# Altium schematic symbol library LATTICEPLDS_Library.SchLib: 291 symbols (part 17 of 32)
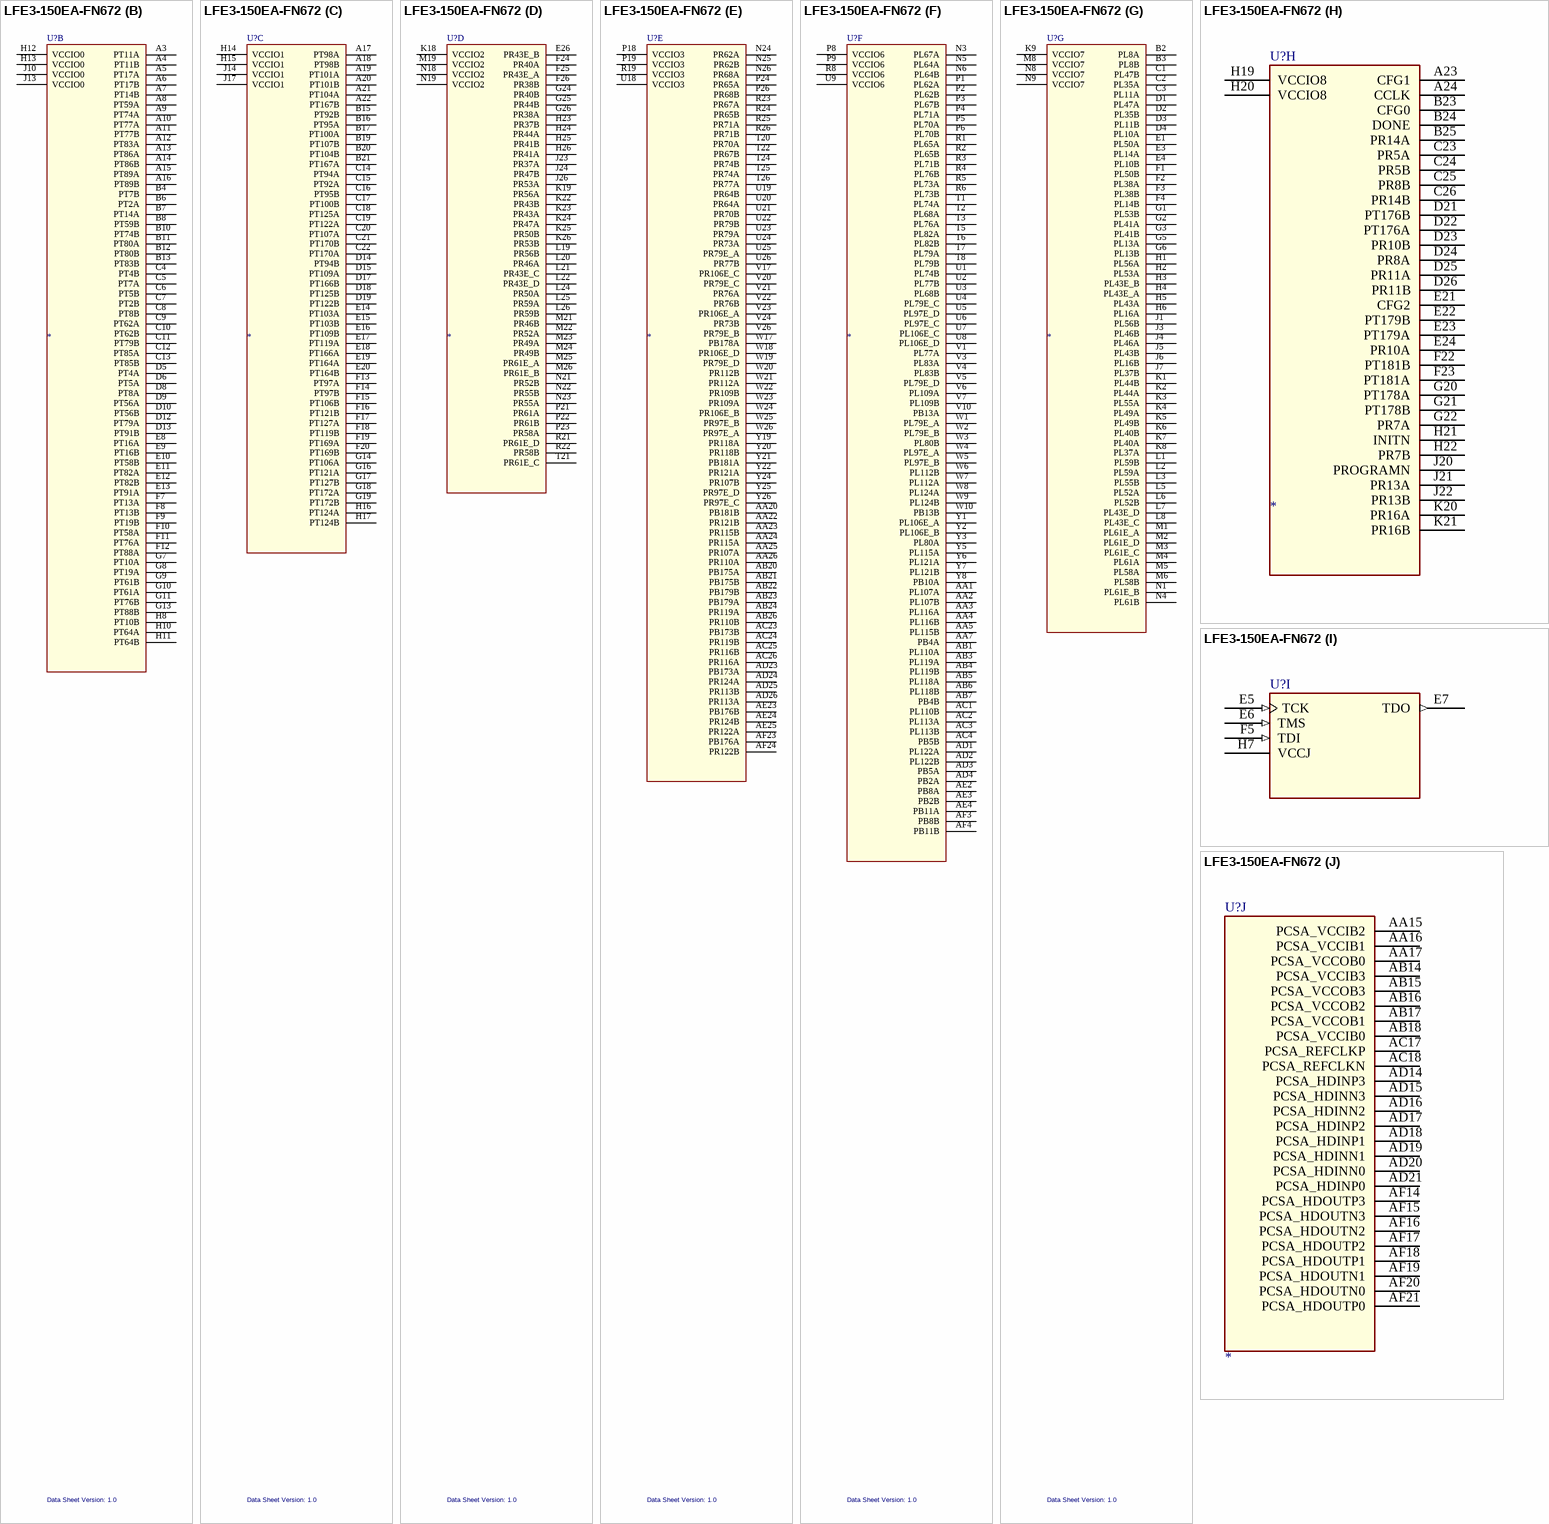
[diagram p319: symbol LFE3-150EA-FN672]

## LFE3-150EA-FN672
designator U?  Data Sheet Version: 1.0
SWAP_INFO: (S1+S2+S3+S4+S5+S6+S7+S8+S9+S10); SPLIT_INST: TRUE
part A pins: A2 GND (power), A25 GND (power), AA6 GND (power), AA8 GND (power), AA9 GND (power), AA10 PCSB_VCCOB3, AA11 PCSB_VCCIB2, AA12 PCSB_VCCOB1, AA13 GND (power), AA14 GND (power), AA18 GND (power), AA19 GND (power), AA21 GND (power), AB2 GND (power), AB8 GND (power), AB9 PCSB_VCCIB3, AB10 PCSB_VCCOB2, AB11 PCSB_VCCIB1, AB12 PCSB_VCCOB0, AB13 PCSB_VCCIB0, AB19 GND (power), AB25 GND (power), AC5 GND (power), AC6 GND (power), AC7 GND (power), AC8 GND (power), AC9 PCSB_REFCLKP, AC10 PCSB_REFCLKN, AC11 GND (power), AC12 GND (power), AC13 GND (power), AC14 GND (power), AC15 GND (power), AC16 GND (power), AC19 GND (power), AC20 GND (power), AC21 GND (power), AC22 GND (power), AD5 GND (power), AD6 PCSB_HDINP3, AD7 PCSB_HDINN3, AD8 PCSB_HDINN2, AD9 PCSB_HDINP2, AD10 PCSB_HDINP1, AD11 PCSB_HDINN1, AD12 PCSB_HDINN0, AD13 PCSB_HDINP0, AD22 GND (power), AE1 GND (power), AE5 GND (power), AE6 GND (power), AE7 GND (power), AE8 GND (power), AE9 GND (power), AE10 GND (power), AE11 GND (power), AE12 GND (power), AE13 GND (power), AE14 GND (power), AE15 GND (power), AE16 GND (power), AE17 GND (power), AE18 GND (power), AE19 GND (power), AE20 GND (power), AE21 GND (power), AE22 GND (power), AE26 GND (power), AF2 GND (power), AF5 GND (power), AF6 PCSB_HDOUTP3, AF7 PCSB_HDOUTN3, AF8 PCSB_HDOUTN2, AF9 PCSB_HDOUTP2, AF10 PCSB_HDOUTP1, AF11 PCSB_HDOUTN1, AF12 PCSB_HDOUTN0, AF13 PCSB_HDOUTP0, AF22 GND (power), AF25 GND (power), B1 GND (power), B5 GND (power), B9 GND (power), B14 GND (power), B18 GND (power), B22 GND (power), B26 GND (power), D7 GND (power), D11 GND (power), D16 GND (power), D20 GND (power), E2 GND (power), E25 GND (power), F6 GND (power), F21 GND (power), G4 GND (power), G12 GND (power), G15 GND (power), G23 GND (power), H9 GND (power), H18 GND (power), J2 GND (power), J8 GND (power), J9 VCCAUX, J11 VCCAUX, J12 GND (power), J15 GND (power), J16 VCCAUX, J18 VCCAUX, J19 GND (power), J25 GND (power), K10 GND (power), K11 VCC, K12 VCC, K13 VCC, K14 VCC, K15 VCC, K16 VCC, K17 GND (power), L4 GND (power), L9 VCCAUX, L10 VCC, L11 VCC, L12 VCC, L13 GND (power), L14 GND (power), L15 VCC, L16 VCC, L17 VCC, L18 VCCAUX, L23 GND (power), M7 GND (power), M9 GND (power), M10 VCCPLL_L, M11 VCC, M12 GND (power), M13 GND (power), M14 GND (power), M15 GND (power), M16 VCC, M17 VCCPLL_R, M18 GND (power), M20 GND (power), N2 GND (power), N7 VTT7 (power), N10 VCC, N11 GND (power), N12 GND (power), N13 GND (power), N14 GND (power), N15 GND (power), N16 GND (power), N17 VCC, N20 VTT2 (power), P7 VTT6 (power), P10 VCC, P11 GND (power), P12 GND (power), P13 GND (power), P14 GND (power), P15 GND (power), P16 GND (power), P17 VCC, P20 VTT3 (power), P25 GND (power), R7 GND (power), R9 GND (power), R10 VCCPLL_L, R11 VCC, R12 GND (power), R13 GND (power), R14 GND (power), R15 GND (power), R16 VCC, R17 VCCPLL_R, R18 XRES, R20 GND (power), T4 GND (power), T9 VCCAUX, T10 VCC, T11 VCC, T12 VCC, T13 GND (power), T14 GND (power), T15 VCC, T16 VCC, T17 VCC, T18 VCCAUX, T19 GND (power), T23 GND (power), U10 RESERVED, U11 VCC, U12 VCC, U13 VCC, U14 VCC, U15 VCC, U16 VCC, U17 GND (power), V2 GND (power), V8 RESERVED, V9 VCCAUX, V11 VCCAUX, V12 GND (power), V13 VCCA, V14 VCCA, V15 GND (power), V16 VCCAUX, V18 VCCAUX, V19 GND (power), V25 GND (power), W11 GND (power), W12 VCCA, W13 VCCA, W14 VCCA, W15 VCCA, W16 GND (power), Y4 GND (power), Y9 GND (power), Y10 GND (power), Y11 GND (power), Y12 GND (power), Y13 VCCA, Y14 VCCA, Y15 GND (power), Y16 GND (power), Y17 GND (power), Y18 GND (power), Y23 GND (power)
part B pins: A3 PT11A, A4 PT11B, A5 PT17A, A6 PT17B, A7 PT14B, A8 PT59A, A9 PT74A, A10 PT77A, A11 PT77B, A12 PT83A, A13 PT86A, A14 PT86B, A15 PT89A, A16 PT89B, B4 PT7B, B6 PT2A, B7 PT14A, B8 PT59B, B10 PT74B, B11 PT80A, B12 PT80B, B13 PT83B, C4 PT4B, C5 PT7A, C6 PT5B, C7 PT2B, C8 PT8B, C9 PT62A, C10 PT62B, C11 PT79B, C12 PT85A, C13 PT85B, D5 PT4A, D6 PT5A, D8 PT8A, D9 PT56A, D10 PT56B, D12 PT79A, D13 PT91B, E8 PT16A, E9 PT16B, E10 PT58B, E11 PT82A, E12 PT82B, E13 PT91A, F7 PT13A, F8 PT13B, F9 PT19B, F10 PT58A, F11 PT76A, F12 PT88A, G7 PT10A, G8 PT19A, G9 PT61B, G10 PT61A, G11 PT76B, G13 PT88B, H8 PT10B, H10 PT64A, H11 PT64B, H12 VCCIO0 (power), H13 VCCIO0 (power), J10 VCCIO0 (power), J13 VCCIO0 (power)
part C pins: A17 PT98A, A18 PT98B, A19 PT101A, A20 PT101B, A21 PT104A, A22 PT167B, B15 PT92B, B16 PT95A, B17 PT100A, B19 PT107B, B20 PT104B, B21 PT167A, C14 PT94A, C15 PT92A, C16 PT95B, C17 PT100B, C18 PT125A, C19 PT122A, C20 PT107A, C21 PT170B, C22 PT170A, D14 PT94B, D15 PT109A, D17 PT166B, D18 PT125B, D19 PT122B, E14 PT103A, E15 PT103B, E16 PT109B, E17 PT119A, E18 PT166A, E19 PT164A, E20 PT164B, F13 PT97A, F14 PT97B, F15 PT106B, F16 PT121B, F17 PT127A, F18 PT119B, F19 PT169A, F20 PT169B, G14 PT106A, G16 PT121A, G17 PT127B, G18 PT172A, G19 PT172B, H14 VCCIO1 (power), H15 VCCIO1 (power), H16 PT124A, H17 PT124B, J14 VCCIO1 (power), J17 VCCIO1 (power)
part D pins: E26 PR43E_B, F24 PR40A, F25 PR43E_A, F26 PR38B, G24 PR40B, G25 PR44B, G26 PR38A, H23 PR37B, H24 PR44A, H25 PR41B, H26 PR41A, J23 PR37A, J24 PR47B, J26 PR53A, K18 VCCIO2 (power), K19 PR56A, K22 PR43B, K23 PR43A, K24 PR47A, K25 PR50B, K26 PR53B, L19 PR56B, L20 PR46A, L21 PR43E_C, L22 PR43E_D, L24 PR50A, L25 PR59A, L26 PR59B, M19 VCCIO2 (power), M21 PR46B, M22 PR52A, M23 PR49A, M24 PR49B, M25 PR61E_A, M26 PR61E_B, N18 VCCIO2 (power), N19 VCCIO2 (power), N21 PR52B, N22 PR55B, N23 PR55A, P21 PR61A, P22 PR61B, P23 PR58A, R21 PR61E_D, R22 PR58B, T21 PR61E_C
part E pins: AA20 PB181B, AA22 PR121B, AA23 PR115B, AA24 PR115A, AA25 PR107A, AA26 PR110A, AB20 PB175A, AB21 PB175B, AB22 PB179B, AB23 PB179A, AB24 PR119A, AB26 PR110B, AC23 PB173B, AC24 PR119B, AC25 PR116B, AC26 PR116A, AD23 PB173A, AD24 PR124A, AD25 PR113B, AD26 PR113A, AE23 PB176B, AE24 PR124B, AE25 PR122A, AF23 PB176A, AF24 PR122B, N24 PR62A, N25 PR62B, N26 PR68A, P18 VCCIO3 (power), P19 VCCIO3 (power), P24 PR65A, P26 PR68B, R19 VCCIO3 (power), R23 PR67A, R24 PR65B, R25 PR71A, R26 PR71B, T20 PR70A, T22 PR67B, T24 PR74B, T25 PR74A, T26 PR77A, U18 VCCIO3 (power), U19 PR64B, U20 PR64A, U21 PR70B, U22 PR79B, U23 PR79A, U24 PR73A, U25 PR79E_A, U26 PR77B, V17 PR106E_C, V20 PR79E_C, V21 PR76A, V22 PR76B, V23 PR106E_A, V24 PR73B, V26 PR79E_B, W17 PB178A, W18 PR106E_D, W19 PR79E_D, W20 PR112B, W21 PR112A, W22 PR109B, W23 PR109A, W24 PR106E_B, W25 PR97E_B, W26 PR97E_A, Y19 PR118A, Y20 PR118B, Y21 PB181A, Y22 PR121A, Y24 PR107B, Y25 PR97E_D, Y26 PR97E_C
part F pins: AA1 PL107A, AA2 PL107B, AA3 PL116A, AA4 PL116B, AA5 PL115B, AA7 PB4A, AB1 PL110A, AB3 PL119A, AB4 PL119B, AB5 PL118A, AB6 PL118B, AB7 PB4B, AC1 PL110B, AC2 PL113A, AC3 PL113B, AC4 PB5B, AD1 PL122A, AD2 PL122B, AD3 PB5A, AD4 PB2A, AE2 PB8A, AE3 PB2B, AE4 PB11A, AF3 PB8B, AF4 PB11B, N3 PL67A, N5 PL64A, N6 PL64B, P1 PL62A, P2 PL62B, P3 PL67B, P4 PL71A, P5 PL70A, P6 PL70B, P8 VCCIO6 (power), P9 VCCIO6 (power), R1 PL65A, R2 PL65B, R3 PL71B, R4 PL76B, R5 PL73A, R6 PL73B, R8 VCCIO6 (power), T1 PL74A, T2 PL68A, T3 PL76A, T5 PL82A, T6 PL82B, T7 PL79A, T8 PL79B, U1 PL74B, U2 PL77B, U3 PL68B, U4 PL79E_C, U5 PL97E_D, U6 PL97E_C, U7 PL106E_C, U8 PL106E_D, U9 VCCIO6 (power), V1 PL77A, V3 PL83A, V4 PL83B, V5 PL79E_D, V6 PL109A, V7 PL109B, V10 PB13A, W1 PL79E_A, W2 PL79E_B, W3 PL80B, W4 PL97E_A, W5 PL97E_B, W6 PL112B, W7 PL112A, W8 PL124A, W9 PL124B, W10 PB13B, Y1 PL106E_A, Y2 PL106E_B, Y3 PL80A, Y5 PL115A, Y6 PL121A, Y7 PL121B, Y8 PB10A
part G pins: B2 PL8A, B3 PL8B, C1 PL47B, C2 PL35A, C3 PL11A, D1 PL47A, D2 PL35B, D3 PL11B, D4 PL10A, E1 PL50A, E3 PL14A, E4 PL10B, F1 PL50B, F2 PL38A, F3 PL38B, F4 PL14B, G1 PL53B, G2 PL41A, G3 PL41B, G5 PL13A, G6 PL13B, H1 PL56A, H2 PL53A, H3 PL43E_B, H4 PL43E_A, H5 PL43A, H6 PL16A, J1 PL56B, J3 PL46B, J4 PL46A, J5 PL43B, J6 PL16B, J7 PL37B, K1 PL44B, K2 PL44A, K3 PL55A, K4 PL49A, K5 PL49B, K6 PL40B, K7 PL40A, K8 PL37A, K9 VCCIO7 (power), L1 PL59B, L2 PL59A, L3 PL55B, L5 PL52A, L6 PL52B, L7 PL43E_D, L8 PL43E_C, M1 PL61E_A, M2 PL61E_D, M3 PL61E_C, M4 PL61A, M5 PL58A, M6 PL58B, M8 VCCIO7 (power), N1 PL61E_B, N4 PL61B, N8 VCCIO7 (power), N9 VCCIO7 (power)
part H pins: A23 CFG1, A24 CCLK, B23 CFG0, B24 DONE, B25 PR14A, C23 PR5A, C24 PR5B, C25 PR8B, C26 PR14B, D21 PT176B, D22 PT176A, D23 PR10B, D24 PR8A, D25 PR11A, D26 PR11B, E21 CFG2, E22 PT179B, E23 PT179A, E24 PR10A, F22 PT181B, F23 PT181A, G20 PT178A, G21 PT178B, G22 PR7A, H19 VCCIO8 (power), H20 VCCIO8 (power), H21 INITN, H22 PR7B, J20 PROGRAMN, J21 PR13A, J22 PR13B, K20 PR16A, K21 PR16B
part I pins: E5 TCK (in), E6 TMS (in), E7 TDO (out), F5 TDI (in), H7 VCCJ (power)
part J pins: AA15 PCSA_VCCIB2, AA16 PCSA_VCCIB1, AA17 PCSA_VCCOB0, AB14 PCSA_VCCIB3, AB15 PCSA_VCCOB3, AB16 PCSA_VCCOB2, AB17 PCSA_VCCOB1, AB18 PCSA_VCCIB0, AC17 PCSA_REFCLKP, AC18 PCSA_REFCLKN, AD14 PCSA_HDINP3, AD15 PCSA_HDINN3, AD16 PCSA_HDINN2, AD17 PCSA_HDINP2, AD18 PCSA_HDINP1, AD19 PCSA_HDINN1, AD20 PCSA_HDINN0, AD21 PCSA_HDINP0, AF14 PCSA_HDOUTP3, AF15 PCSA_HDOUTN3, AF16 PCSA_HDOUTN2, AF17 PCSA_HDOUTP2, AF18 PCSA_HDOUTP1, AF19 PCSA_HDOUTN1, AF20 PCSA_HDOUTN0, AF21 PCSA_HDOUTP0

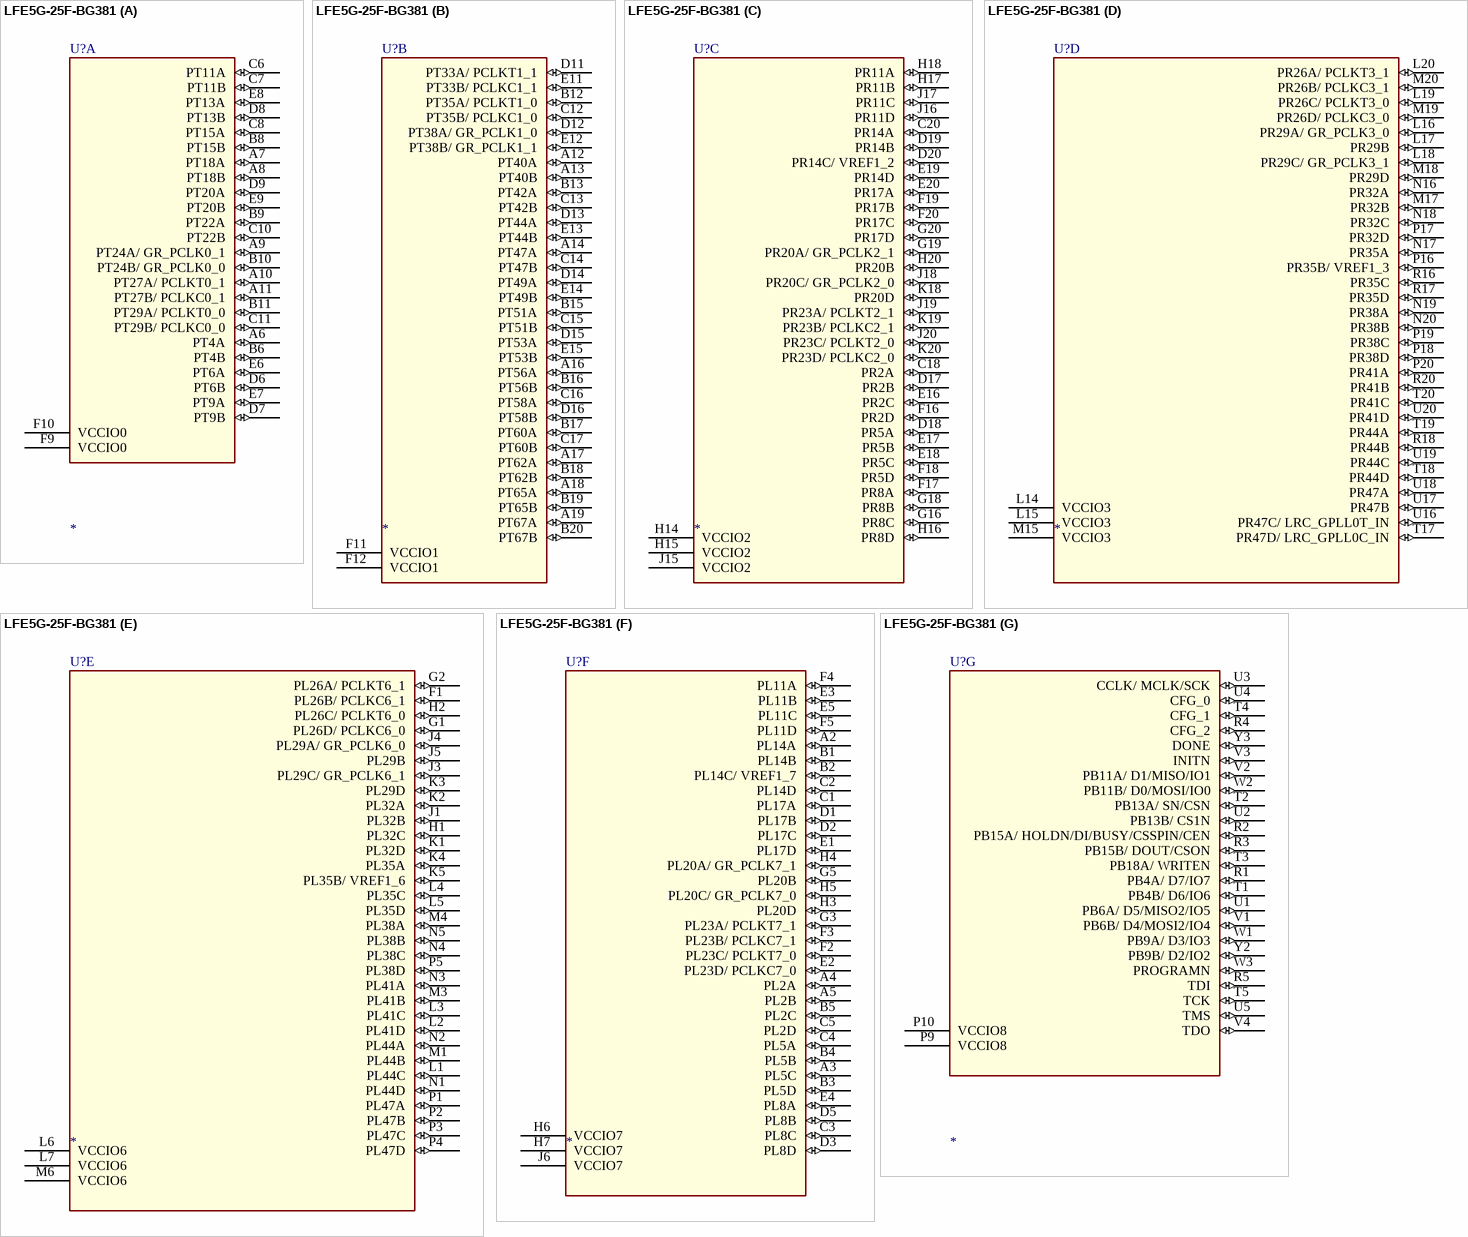
[diagram p156: symbol LFE5G-25F-BG381]

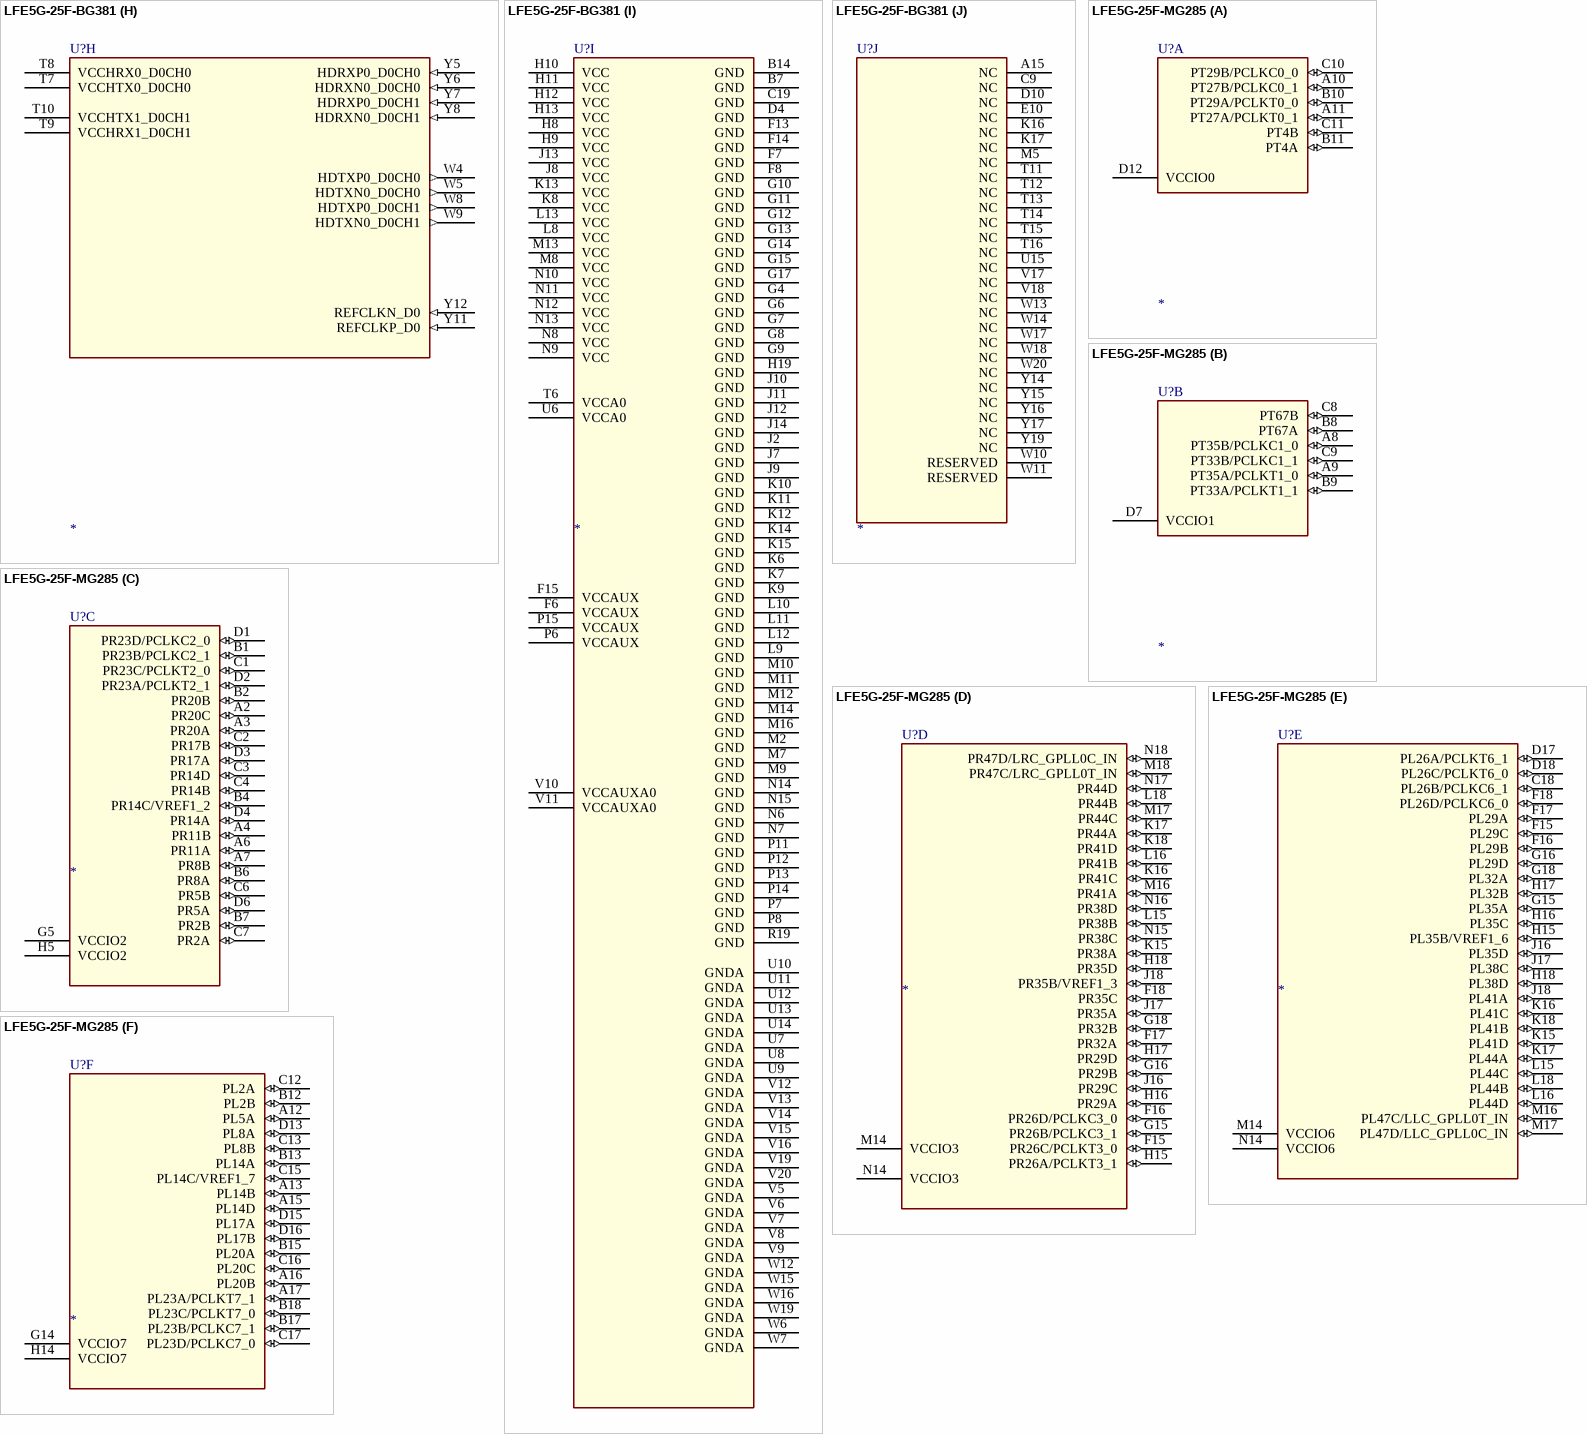
[diagram p157: symbols LFE5G-25F-BG381 to LFE5G-25F-MG285]

## LFE5G-25F-BG381
designator U?
SWAP_INFO: (S1+S2+S3+S4+S5+S6+S7+S8+S9+S10); SPLIT_INST: TRUE
part A pins: A6 PT4A (io), A7 PT18A (io), A8 PT18B (io), A9 PT24A/ GR_PCLK0_1 (io), A10 PT27A/ PCLKT0_1 (io), A11 PT27B/ PCLKC0_1 (io), B6 PT4B (io), B8 PT15B (io), B9 PT22A (io), B10 PT24B/ GR_PCLK0_0 (io), B11 PT29A/ PCLKT0_0 (io), C6 PT11A (io), C7 PT11B (io), C8 PT15A (io), C10 PT22B (io), C11 PT29B/ PCLKC0_0 (io), D6 PT6B (io), D7 PT9B (io), D8 PT13B (io), D9 PT20A (io), E6 PT6A (io), E7 PT9A (io), E8 PT13A (io), E9 PT20B (io), F9 VCCIO0 (power), F10 VCCIO0 (power)
part B pins: A12 PT40A (io), A13 PT40B (io), A14 PT47A (io), A16 PT56A (io), A17 PT62A (io), A18 PT65A (io), A19 PT67A (io), B12 PT35A/ PCLKT1_0 (io), B13 PT42A (io), B15 PT51A (io), B16 PT56B (io), B17 PT60A (io), B18 PT62B (io), B19 PT65B (io), B20 PT67B (io), C12 PT35B/ PCLKC1_0 (io), C13 PT42B (io), C14 PT47B (io), C15 PT51B (io), C16 PT58A (io), C17 PT60B (io), D11 PT33A/ PCLKT1_1 (io), D12 PT38A/ GR_PCLK1_0 (io), D13 PT44A (io), D14 PT49A (io), D15 PT53A (io), D16 PT58B (io), E11 PT33B/ PCLKC1_1 (io), E12 PT38B/ GR_PCLK1_1 (io), E13 PT44B (io), E14 PT49B (io), E15 PT53B (io), F11 VCCIO1 (power), F12 VCCIO1 (power)
part C pins: C18 PR2A (io), C20 PR14A (io), D17 PR2B (io), D18 PR5A (io), D19 PR14B (io), D20 PR14C/ VREF1_2 (io), E16 PR2C (io), E17 PR5B (io), E18 PR5C (io), E19 PR14D (io), E20 PR17A (io), F16 PR2D (io), F17 PR8A (io), F18 PR5D (io), F19 PR17B (io), F20 PR17C (io), G16 PR8C (io), G18 PR8B (io), G19 PR20A/ GR_PCLK2_1 (io), G20 PR17D (io), H14 VCCIO2 (power), H15 VCCIO2 (power), H16 PR8D (io), H17 PR11B (io), H18 PR11A (io), H20 PR20B (io), J15 VCCIO2 (power), J16 PR11D (io), J17 PR11C (io), J18 PR20C/ GR_PCLK2_0 (io), J19 PR23A/ PCLKT2_1 (io), J20 PR23C/ PCLKT2_0 (io), K18 PR20D (io), K19 PR23B/ PCLKC2_1 (io), K20 PR23D/ PCLKC2_0 (io)
part D pins: L14 VCCIO3 (power), L15 VCCIO3 (power), L16 PR29A/ GR_PCLK3_0 (io), L17 PR29B (io), L18 PR29C/ GR_PCLK3_1 (io), L19 PR26C/ PCLKT3_0 (io), L20 PR26A/ PCLKT3_1 (io), M15 VCCIO3 (power), M17 PR32B (io), M18 PR29D (io), M19 PR26D/ PCLKC3_0 (io), M20 PR26B/ PCLKC3_1 (io), N16 PR32A (io), N17 PR35A (io), N18 PR32C (io), N19 PR38A (io), N20 PR38B (io), P16 PR35B/ VREF1_3 (io), P17 PR32D (io), P18 PR38D (io), P19 PR38C (io), P20 PR41A (io), R16 PR35C (io), R17 PR35D (io), R18 PR44B (io), R20 PR41B (io), T17 PR47D/ LRC_GPLL0C_IN (io), T18 PR44D (io), T19 PR44A (io), T20 PR41C (io), U16 PR47C/ LRC_GPLL0T_IN (io), U17 PR47B (io), U18 PR47A (io), U19 PR44C (io), U20 PR41D (io)
part E pins: F1 PL26B/ PCLKC6_1 (io), G1 PL26D/ PCLKC6_0 (io), G2 PL26A/ PCLKT6_1 (io), H1 PL32C (io), H2 PL26C/ PCLKT6_0 (io), J1 PL32B (io), J3 PL29C/ GR_PCLK6_1 (io), J4 PL29A/ GR_PCLK6_0 (io), J5 PL29B (io), K1 PL32D (io), K2 PL32A (io), K3 PL29D (io), K4 PL35A (io), K5 PL35B/ VREF1_6 (io), L1 PL44C (io), L2 PL41D (io), L3 PL41C (io), L4 PL35C (io), L5 PL35D (io), L6 VCCIO6 (power), L7 VCCIO6 (power), M1 PL44B (io), M3 PL41B (io), M4 PL38A (io), M6 VCCIO6 (power), N1 PL44D (io), N2 PL44A (io), N3 PL41A (io), N4 PL38C (io), N5 PL38B (io), P1 PL47A (io), P2 PL47B (io), P3 PL47C (io), P4 PL47D (io), P5 PL38D (io)
part F pins: A2 PL14A (io), A3 PL5C (io), A4 PL2A (io), A5 PL2B (io), B1 PL14B (io), B2 PL14C/ VREF1_7 (io), B3 PL5D (io), B4 PL5B (io), B5 PL2C (io), C1 PL17A (io), C2 PL14D (io), C3 PL8C (io), C4 PL5A (io), C5 PL2D (io), D1 PL17B (io), D2 PL17C (io), D3 PL8D (io), D5 PL8B (io), E1 PL17D (io), E2 PL23D/ PCLKC7_0 (io), E3 PL11B (io), E4 PL8A (io), E5 PL11C (io), F2 PL23C/ PCLKT7_0 (io), F3 PL23B/ PCLKC7_1 (io), F4 PL11A (io), F5 PL11D (io), G3 PL23A/ PCLKT7_1 (io), G5 PL20B (io), H3 PL20D (io), H4 PL20A/ GR_PCLK7_1 (io), H5 PL20C/ GR_PCLK7_0 (io), H6 VCCIO7 (power), H7 VCCIO7 (power), J6 VCCIO7 (power)
part G pins: P9 VCCIO8 (power), P10 VCCIO8 (power), R1 PB4A/ D7/IO7 (io), R2 PB15A/ HOLDN/DI/BUSY/CSSPIN/CEN (io), R3 PB15B/ DOUT/CSON (io), R4 CFG_2 (io), R5 TDI (io), T1 PB4B/ D6/IO6 (io), T2 PB13A/ SN/CSN (io), T3 PB18A/ WRITEN (io), T4 CFG_1 (io), T5 TCK (io), U1 PB6A/ D5/MISO2/IO5 (io), U2 PB13B/ CS1N (io), U3 CCLK/ MCLK/SCK (io), U4 CFG_0 (io), U5 TMS (io), V1 PB6B/ D4/MOSI2/IO4 (io), V2 PB11A/ D1/MISO/IO1 (io), V3 INITN (io), V4 TDO (io), W1 PB9A/ D3/IO3 (io), W2 PB11B/ D0/MOSI/IO0 (io), W3 PROGRAMN (io), Y2 PB9B/ D2/IO2 (io), Y3 DONE (io)
part H pins: T7 VCCHTX0_D0CH0 (power), T8 VCCHRX0_D0CH0 (power), T9 VCCHRX1_D0CH1 (power), T10 VCCHTX1_D0CH1 (power), W4 HDTXP0_D0CH0 (out), W5 HDTXN0_D0CH0 (out), W8 HDTXP0_D0CH1 (out), W9 HDTXN0_D0CH1 (out), Y5 HDRXP0_D0CH0 (in), Y6 HDRXN0_D0CH0 (in), Y7 HDRXP0_D0CH1 (in), Y8 HDRXN0_D0CH1 (in), Y11 REFCLKP_D0 (in), Y12 REFCLKN_D0 (in)
part I pins: B7 GND (power), B14 GND (power), C19 GND (power), D4 GND (power), F6 VCCAUX (power), F7 GND (power), F8 GND (power), F13 GND (power), F14 GND (power), F15 VCCAUX (power), G4 GND (power), G6 GND (power), G7 GND (power), G8 GND (power), G9 GND (power), G10 GND (power), G11 GND (power), G12 GND (power), G13 GND (power), G14 GND (power), G15 GND (power), G17 GND (power), H8 VCC (power), H9 VCC (power), H10 VCC (power), H11 VCC (power), H12 VCC (power), H13 VCC (power), H19 GND (power), J2 GND (power), J7 GND (power), J8 VCC (power), J9 GND (power), J10 GND (power), J11 GND (power), J12 GND (power), J13 VCC (power), J14 GND (power), K6 GND (power), K7 GND (power), K8 VCC (power), K9 GND (power), K10 GND (power), K11 GND (power), K12 GND (power), K13 VCC (power), K14 GND (power), K15 GND (power), L8 VCC (power), L9 GND (power), L10 GND (power), L11 GND (power), L12 GND (power), L13 VCC (power), M2 GND (power), M7 GND (power), M8 VCC (power), M9 GND (power), M10 GND (power), M11 GND (power), M12 GND (power), M13 VCC (power), M14 GND (power), M16 GND (power), N6 GND (power), N7 GND (power), N8 VCC (power), N9 VCC (power), N10 VCC (power), N11 VCC (power), N12 VCC (power), N13 VCC (power), N14 GND (power), N15 GND (power), P6 VCCAUX (power), P7 GND (power), P8 GND (power), P11 GND (power), P12 GND (power), P13 GND (power), P14 GND (power), P15 VCCAUX (power), R19 GND (power), T6 VCCA0 (power), U6 VCCA0 (power), U7 GNDA (power), U8 GNDA (power), U9 GNDA (power), U10 GNDA (power), U11 GNDA (power), U12 GNDA (power), U13 GNDA (power), U14 GNDA (power), V5 GNDA (power), V6 GNDA (power), V7 GNDA (power), V8 GNDA (power), V9 GNDA (power), V10 VCCAUXA0 (power), V11 VCCAUXA0 (power), V12 GNDA (power), V13 GNDA (power), V14 GNDA (power), V15 GNDA (power), V16 GNDA (power), V19 GNDA (power), V20 GNDA (power), W6 GNDA (power), W7 GNDA (power), W12 GNDA (power), W15 GNDA (power), W16 GNDA (power), W19 GNDA (power)
part J pins: A15 NC (power), C9 NC (power), D10 NC (power), E10 NC (power), K16 NC (power), K17 NC (power), M5 NC (power), T11 NC (power), T12 NC (power), T13 NC (power), T14 NC (power), T15 NC (power), T16 NC (power), U15 NC (power), V17 NC (power), V18 NC (power), W10 RESERVED (power), W11 RESERVED (power), W13 NC (power), W14 NC (power), W17 NC (power), W18 NC (power), W20 NC (power), Y14 NC (power), Y15 NC (power), Y16 NC (power), Y17 NC (power), Y19 NC (power)
